# Altium footprint library LukaLIBRARY.PcbLib: 784 footprints (part 41 of 49)
Each footprint in its own frame and in the unit in brackets; x right, y up, seen from the top. Pads: shape width x height; smd on the part's side, far side on the other; paste and mask are expansions set on the pad; w line width, h text height; cw(c..) or ccw(c..) is an arc to the next point about the centre after c.
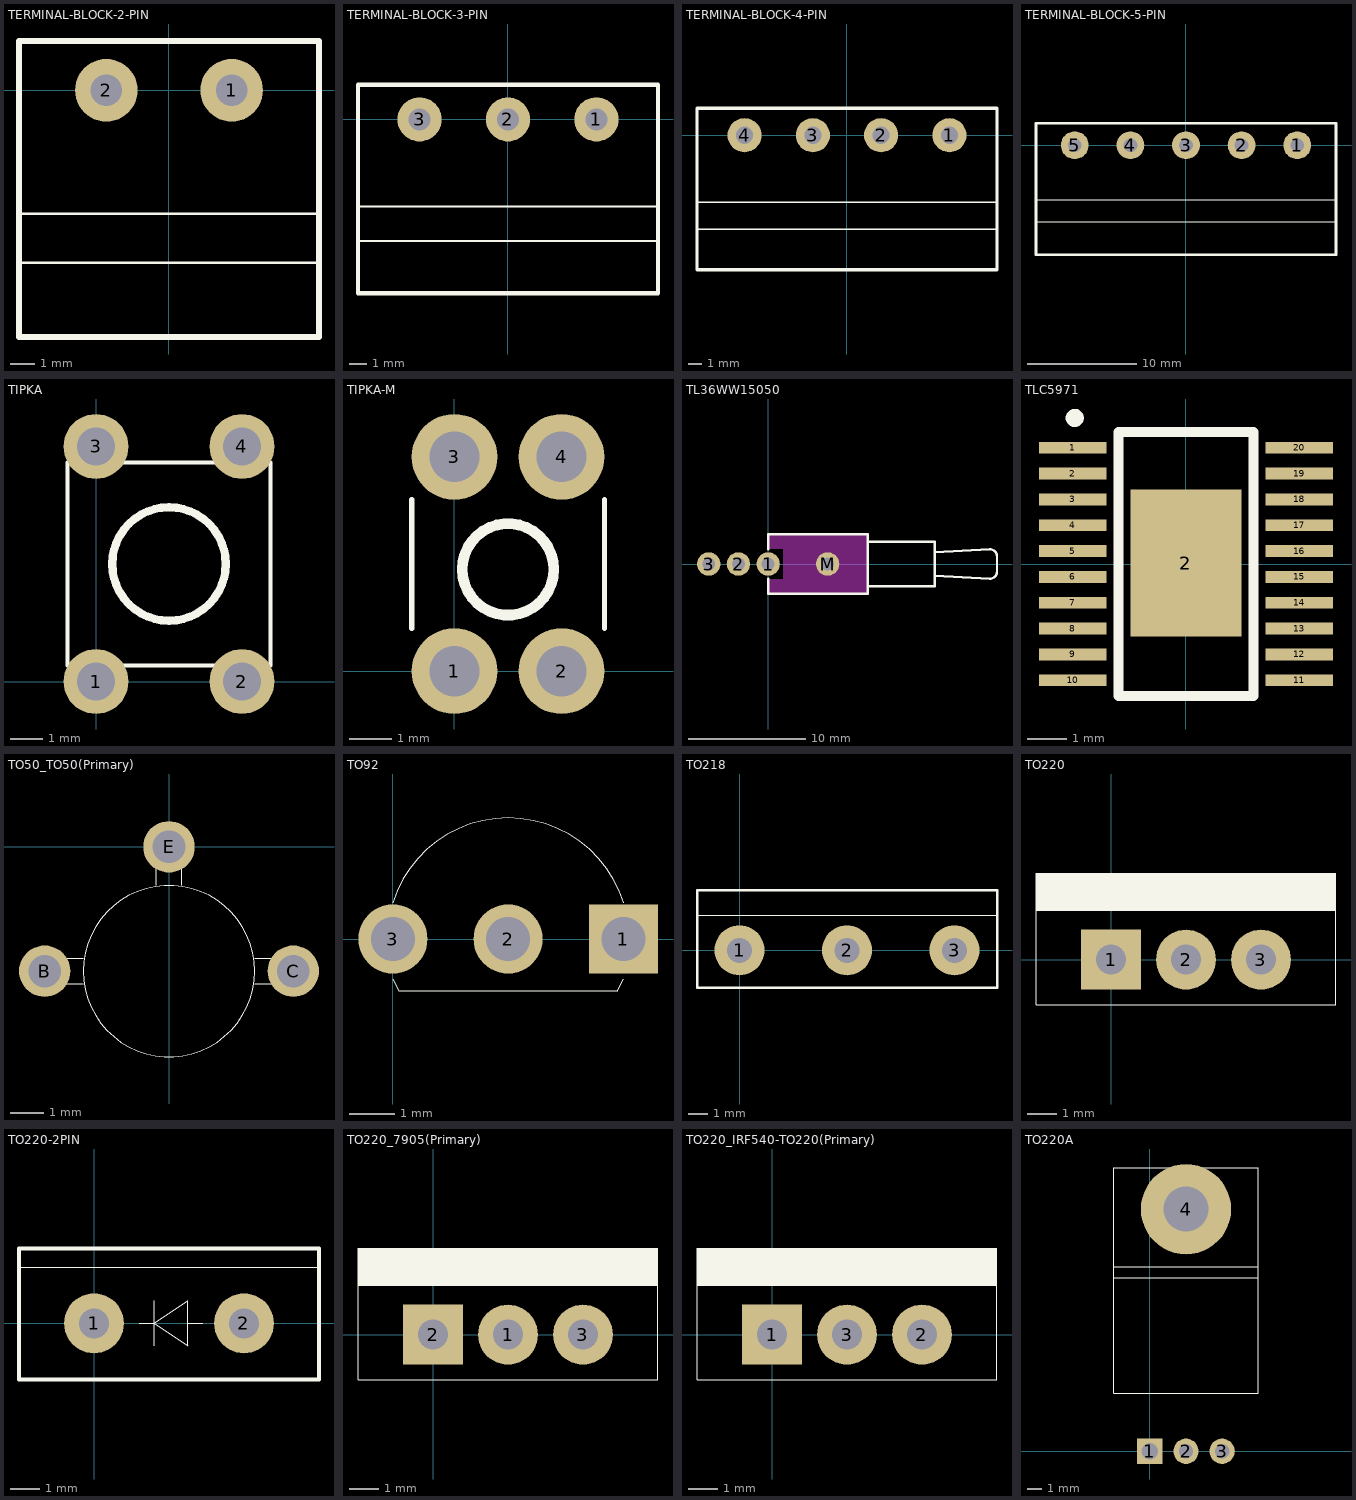
[diagram p40: the footprints below, top view; thin cyan lines are the x and y axes]

## TERMINAL-BLOCK-2-PIN [mm] "5.08mm"
pads (2):
  round 2.54 hole 1.27: 1(2.54,0) 2(-2.54,0)
Top Overlay:
  lines w0.1: -6.08,-6.985 6.08,-6.985 ; -6.08,-5 6.071,-5
  lines w0.254: -6.08,-10 6.08,-10 6.08,2 -6.08,2 -6.08,-10

## TERMINAL-BLOCK-3-PIN [mm] "5.08mm"
pads (3):
  round 2.54 hole 1.27: 1(5.08,0) 2(0,0) 3(-5.08,0)
Top Overlay:
  lines w0.1: -8.62,-6.985 8.62,-6.985 ; -8.62,-5 8.62,-5
  lines w0.254: -8.62,-10 8.62,-10 8.62,2 -8.62,2 -8.62,-10

## TERMINAL-BLOCK-4-PIN [mm] "5.08mm"
pads (4):
  round 2.54 hole 1.27: 1(7.62,0) 2(2.54,0) 3(-2.54,0) 4(-7.62,0)
Top Overlay:
  lines w0.1: -11.16,-6.985 11.16,-6.985 ; -11.16,-5 11.16,-5
  lines w0.254: -11.16,-10 11.16,-10 11.16,2 -11.16,2 -11.16,-10

## TERMINAL-BLOCK-5-PIN [mm] "5.08mm"
pads (5):
  round 2.54 hole 1.27: 1(10.16,0) 2(5.08,0) 3(0,0) 4(-5.08,0) 5(-10.16,0)
Top Overlay:
  lines w0.1: -13.7,-6.985 13.7,-6.985 ; -13.7,-5 13.7,-5
  lines w0.254: -13.7,-10 -13.7,2 13.7,2 13.7,-10 -13.7,-10

## TIPKA [mil]
pads (4):
  round 80 hole 47: 1(0,0) 2(180,0) 3(0,290) 4(180,290)
Top Overlay:
  circle w10: c90,145 r70
  lines w5: -35,20 -35,270 ; 30,20 150,20 ; 30,270 150,270 ; 215,20 215,270

## TIPKA-M [mil]
pads (4):
  round 80 hole 47: 1(0,0) 2(100,0) 3(0,200) 4(100,200)
Top Overlay:
  circle w10: c50,95 r42.72
  lines w5: -40,40 -40,160 ; 140,40 140,160

## TL36WW15050 [mm] "Switch; 4 Leads"
pads (4):
  round 2 hole 1.1: 1(0,0) 2(-2.54,0) 3(-5.08,0) M(5.08,0)
Top Layer keep-out:
  region: 1.27,2.54 1.27,-2.54 8.509,-2.54 8.509,2.54
  region: 0,2.54 0,1.27 1.27,1.27 1.27,2.54
  region: 0,-1.27 0,-2.54 1.27,-2.54 1.27,-1.27
Top Overlay:
  lines w0.2: 0,-1.27 0,-2.54 8.509,-2.54 8.509,2.54 0,2.54 0,1.27 ; 8.509,-1.905 14.224,-1.905 14.224,1.905 8.509,1.905 ; 14.224,-1.016 18.923,-1.27 ccw(c18.923,-0.635) 19.558,-0.635 19.558,0.635 ccw(c18.923,0.635) 18.923,1.27 14.224,1.016

## TLC5971 [mm]
pads (21):
  rect 1.7x0.3 smd: 1(-2.85,2.925) 2(-2.85,2.275) 3(-2.85,1.625) 4(-2.85,0.975) 5(-2.85,0.325) 6(-2.85,-0.325) 7(-2.85,-0.975) 8(-2.85,-1.625) 9(-2.85,-2.275) 10(-2.85,-2.925) 11(2.85,-2.925) 12(2.85,-2.275) 13(2.85,-1.625) 14(2.85,-0.975) 15(2.85,-0.325) 16(2.85,0.325) 17(2.85,0.975) 18(2.85,1.625) 19(2.85,2.275) 20(2.85,2.925)
  rect 2.8x3.7 smd: 2(0,0.025)
Top Overlay:
  circle w0.254: c-2.8,3.675 r0.1
  lines w0.254: -1.7,-3.325 -1.7,3.325 1.7,3.325 1.7,-3.325 -1.7,-3.325

## TO50_TO50(Primary) [mil]
pads (3):
  round 60 hole 38: B(-145,-145) C(145,-145) E(0,0)
Top Overlay:
  circle w1: c0,-145 r100
  lines w1: -120,-160 -100,-160 ; -120,-130 -100,-130 ; -15,-45 -15,-25 ; 15,-45 15,-25 ; 100,-160 120,-160 ; 100,-130 120,-130

## TO92 [mil]
pads (3):
  rect 60x60 hole 38 mask-1000: 1(200,0)
  round 60 hole 38 mask-1000: 2(100,0) 3(0,0)
Top Overlay:
  lines w1: -0.14,31.57 cw(c100,0) 200.14,31.57 ; 0,-35 5,-45 195,-45 200,-35
Top Solder:
  region: 0,30.26 -7.83,29.23 -15.13,26.2 -21.4,21.4 -26.2,15.13 -29.23,7.83 -30.26,0 -29.23,-7.83 -26.2,-15.13 -21.4,-21.4 -15.13,-26.2 -7.83,-29.23 0,-30.26 7.83,-29.23 15.13,-26.2 21.4,-21.4 26.2,-15.13 29.23,-7.83 30.26,0 29.23,7.83 26.2,15.13 21.4,21.4 15.13,26.2 7.83,29.23
  region: 170,-30 230,-30 230,30 170,30
  region: 100,30.26 92.17,29.23 84.87,26.2 78.6,21.4 73.8,15.13 70.77,7.83 69.74,0 70.77,-7.83 73.8,-15.13 78.6,-21.4 84.87,-26.2 92.17,-29.23 100,-30.26 107.83,-29.23 115.13,-26.2 121.4,-21.4 126.2,-15.13 129.23,-7.83 130.26,0 129.23,7.83 126.2,15.13 121.4,21.4 115.13,26.2 107.83,29.23
Bottom Solder:
  region: 0,30.26 -7.83,29.23 -15.13,26.2 -21.4,21.4 -26.2,15.13 -29.23,7.83 -30.26,0 -29.23,-7.83 -26.2,-15.13 -21.4,-21.4 -15.13,-26.2 -7.83,-29.23 0,-30.26 7.83,-29.23 15.13,-26.2 21.4,-21.4 26.2,-15.13 29.23,-7.83 30.26,0 29.23,7.83 26.2,15.13 21.4,21.4 15.13,26.2 7.83,29.23
  region: 170,-30 230,-30 230,30 170,30
  region: 100,30.26 92.17,29.23 84.87,26.2 78.6,21.4 73.8,15.13 70.77,7.83 69.74,0 70.77,-7.83 73.8,-15.13 78.6,-21.4 84.87,-26.2 92.17,-29.23 100,-30.26 107.83,-29.23 115.13,-26.2 121.4,-21.4 126.2,-15.13 129.23,-7.83 130.26,0 129.23,7.83 126.2,15.13 121.4,21.4 115.13,26.2 107.83,29.23

## TO218 [mil]
pads (3):
  round 100 hole 50 mask-1000: 1(0,0) 2(215,0) 3(430,0)
Top Overlay:
  lines w1: -85,70 515,70
  lines w5: -85,-75 -85,120 515,120 515,-75 -85,-75
Top Solder:
  region: 0,50.43 -13.05,48.71 -25.22,43.67 -35.66,35.66 -43.67,25.22 -48.71,13.05 -50.43,0 -48.71,-13.05 -43.67,-25.22 -35.66,-35.66 -25.22,-43.67 -13.05,-48.71 0,-50.43 13.05,-48.71 25.22,-43.67 35.66,-35.66 43.67,-25.22 48.71,-13.05 50.43,0 48.71,13.05 43.67,25.22 35.66,35.66 25.22,43.67 13.05,48.71
  region: 215,50.43 201.95,48.71 189.78,43.67 179.34,35.66 171.33,25.22 166.29,13.05 164.57,0 166.29,-13.05 171.33,-25.22 179.34,-35.66 189.78,-43.67 201.95,-48.71 215,-50.43 228.05,-48.71 240.22,-43.67 250.66,-35.66 258.67,-25.22 263.71,-13.05 265.43,0 263.71,13.05 258.67,25.22 250.66,35.66 240.22,43.67 228.05,48.71
  region: 430,50.43 416.95,48.71 404.78,43.67 394.34,35.66 386.33,25.22 381.29,13.05 379.57,0 381.29,-13.05 386.33,-25.22 394.34,-35.66 404.78,-43.67 416.95,-48.71 430,-50.43 443.05,-48.71 455.22,-43.67 465.66,-35.66 473.67,-25.22 478.71,-13.05 480.43,0 478.71,13.05 473.67,25.22 465.66,35.66 455.22,43.67 443.05,48.71
Bottom Solder:
  region: 0,50.43 -13.05,48.71 -25.22,43.67 -35.66,35.66 -43.67,25.22 -48.71,13.05 -50.43,0 -48.71,-13.05 -43.67,-25.22 -35.66,-35.66 -25.22,-43.67 -13.05,-48.71 0,-50.43 13.05,-48.71 25.22,-43.67 35.66,-35.66 43.67,-25.22 48.71,-13.05 50.43,0 48.71,13.05 43.67,25.22 35.66,35.66 25.22,43.67 13.05,48.71
  region: 215,50.43 201.95,48.71 189.78,43.67 179.34,35.66 171.33,25.22 166.29,13.05 164.57,0 166.29,-13.05 171.33,-25.22 179.34,-35.66 189.78,-43.67 201.95,-48.71 215,-50.43 228.05,-48.71 240.22,-43.67 250.66,-35.66 258.67,-25.22 263.71,-13.05 265.43,0 263.71,13.05 258.67,25.22 250.66,35.66 240.22,43.67 228.05,48.71
  region: 430,50.43 416.95,48.71 404.78,43.67 394.34,35.66 386.33,25.22 381.29,13.05 379.57,0 381.29,-13.05 386.33,-25.22 394.34,-35.66 404.78,-43.67 416.95,-48.71 430,-50.43 443.05,-48.71 455.22,-43.67 465.66,-35.66 473.67,-25.22 478.71,-13.05 480.43,0 478.71,13.05 473.67,25.22 465.66,35.66 455.22,43.67 443.05,48.71

## TO220 [mil]
pads (3):
  rect 80x80 hole 40: 1(0,0)
  round 80 hole 40: 2(100,0) 3(200,0)
Top Overlay:
  region: 300,65 300,115 -100,115 -100,65
  lines w1: -100,-60 -100,115 300,115 300,-60 -100,-60

## TO220-2PIN [mil]
pads (2):
  round 80 hole 40: 1(0,0) 2(200,0)
Top Overlay:
  lines w1: -100,75 300,75 ; 60,0 80,0 ; 80,-30 80,30 ; 125,0 145,0 ; 80,0 125,30 125,-30 80,0
  lines w5: -100,-75 -100,100 300,100 300,-75 -100,-75

## TO220_7905(Primary) [mil]
pads (3):
  round 80 hole 40: 1(100,0) 3(200,0)
  rect 80x80 hole 40: 2(0,0)
Top Overlay:
  region: 300,65 300,115 -100,115 -100,65
  lines w1: -100,-60 -100,115 300,115 300,-60 -100,-60

## TO220_IRF540-TO220(Primary) [mil]
pads (3):
  rect 80x80 hole 40: 1(0,0)
  round 80 hole 40: 2(200,0) 3(100,0)
Top Overlay:
  region: 300,65 300,115 -100,115 -100,65
  lines w1: -100,-60 -100,115 300,115 300,-60 -100,-60

## TO220A [mil]
pads (4):
  rect 70x70 hole 46: 1(0,0)
  round 70 hole 40 mask-1000: 2(100,0) 3(200,0)
  round 250 hole 125: 4(100,670)
Top Overlay:
  lines w1: -100,480 300,480 ; -100,510 300,510 ; -100,160 300,160 300,785 -100,785 -100,160
Top Solder:
  region: 100,35.3 90.86,34.1 82.35,30.57 75.04,24.96 69.43,17.65 65.9,9.14 64.7,0 65.9,-9.14 69.43,-17.65 75.04,-24.96 82.35,-30.57 90.86,-34.1 100,-35.3 109.14,-34.1 117.65,-30.57 124.96,-24.96 130.57,-17.65 134.1,-9.14 135.3,0 134.1,9.14 130.57,17.65 124.96,24.96 117.65,30.57 109.14,34.1
  region: 200,35.3 190.86,34.1 182.35,30.57 175.04,24.96 169.43,17.65 165.9,9.14 164.7,0 165.9,-9.14 169.43,-17.65 175.04,-24.96 182.35,-30.57 190.86,-34.1 200,-35.3 209.14,-34.1 217.65,-30.57 224.96,-24.96 230.57,-17.65 234.1,-9.14 235.3,0 234.1,9.14 230.57,17.65 224.96,24.96 217.65,30.57 209.14,34.1
Bottom Solder:
  region: 100,35.3 90.86,34.1 82.35,30.57 75.04,24.96 69.43,17.65 65.9,9.14 64.7,0 65.9,-9.14 69.43,-17.65 75.04,-24.96 82.35,-30.57 90.86,-34.1 100,-35.3 109.14,-34.1 117.65,-30.57 124.96,-24.96 130.57,-17.65 134.1,-9.14 135.3,0 134.1,9.14 130.57,17.65 124.96,24.96 117.65,30.57 109.14,34.1
  region: 200,35.3 190.86,34.1 182.35,30.57 175.04,24.96 169.43,17.65 165.9,9.14 164.7,0 165.9,-9.14 169.43,-17.65 175.04,-24.96 182.35,-30.57 190.86,-34.1 200,-35.3 209.14,-34.1 217.65,-30.57 224.96,-24.96 230.57,-17.65 234.1,-9.14 235.3,0 234.1,9.14 230.57,17.65 224.96,24.96 217.65,30.57 209.14,34.1